# Altium footprint library Components.PcbLib: 260 footprints (part 9 of 17)
Each footprint in its own frame and in the unit in brackets; x right, y up, seen from the top. Pads: shape width x height; smd on the part's side, far side on the other; paste and mask are expansions set on the pad; w line width, h text height; cw(c..) or ccw(c..) is an arc to the next point about the centre after c.
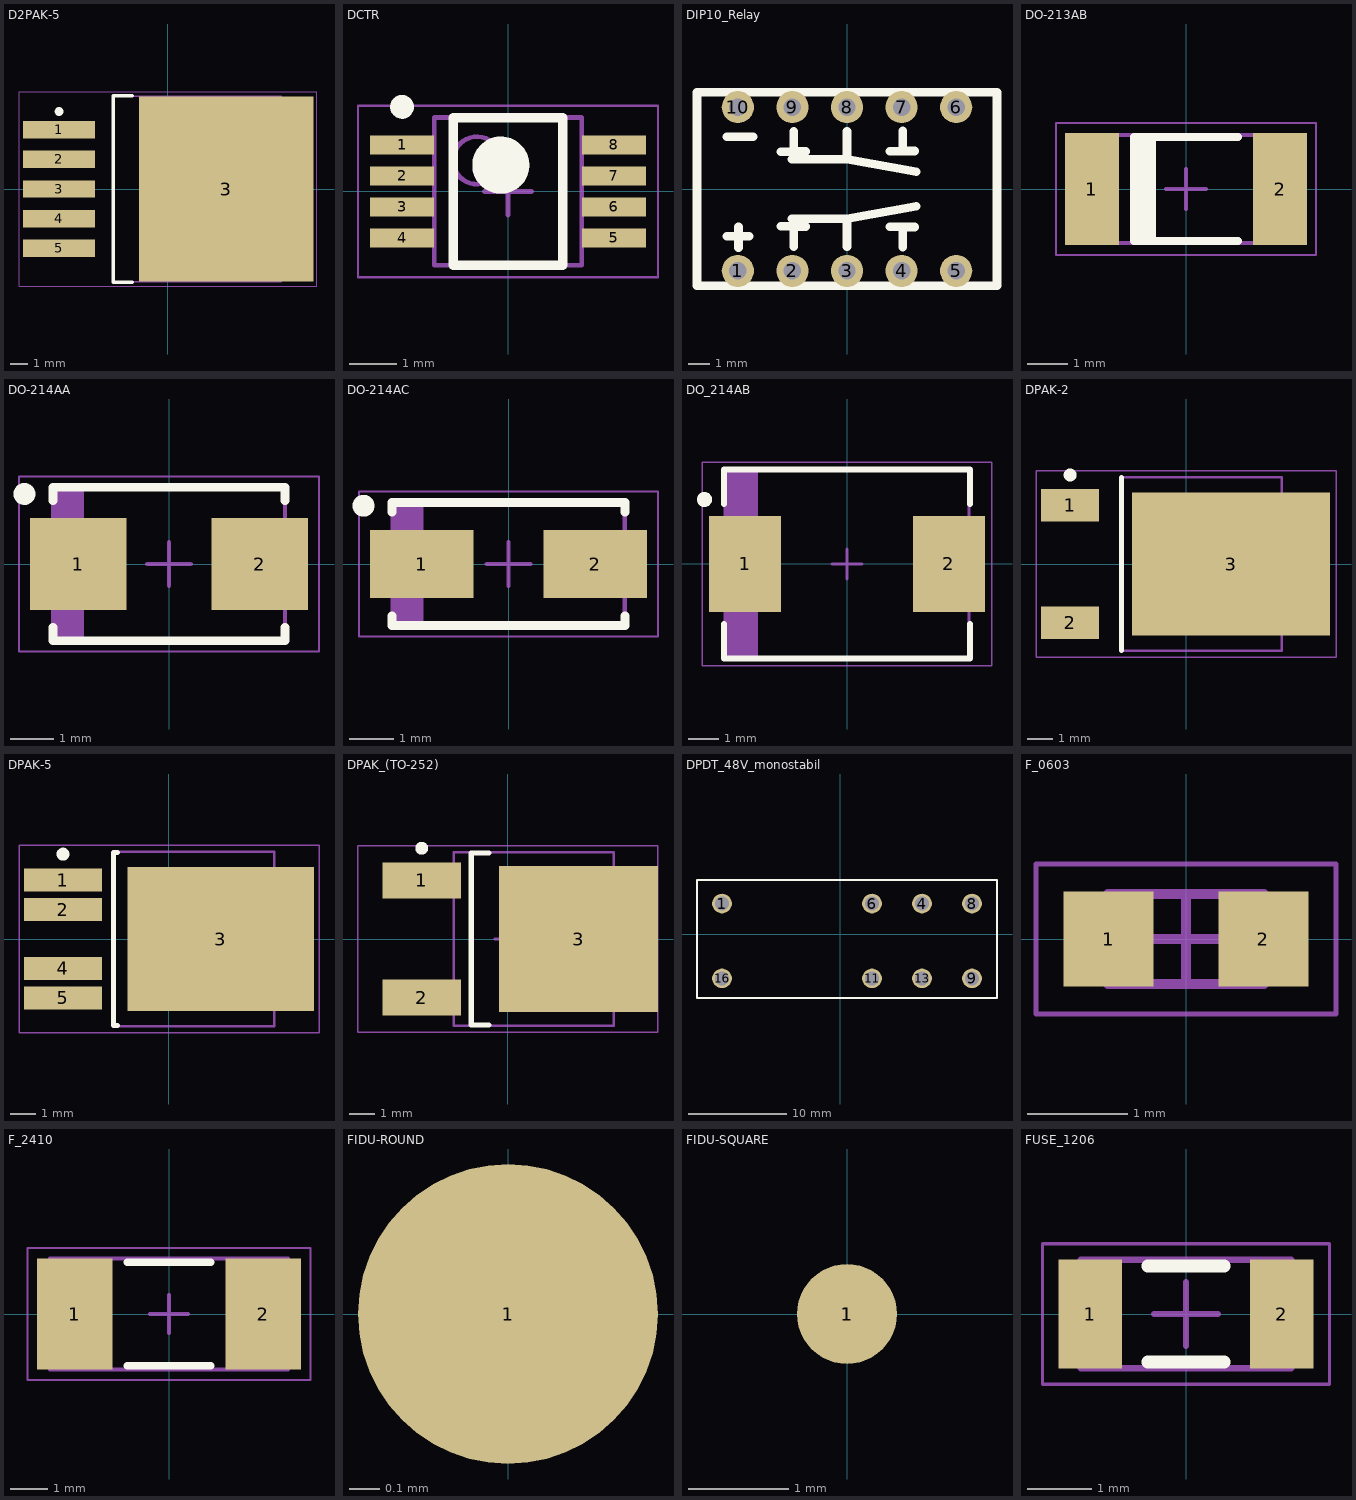
[diagram p8: the footprints below, top view; thin cyan lines are the x and y axes]

## D2PAK-5 [mm]
height 4.83
pads (6):
  rect 4.15x1 smd: 1(-6.25,3.4) 2(-6.25,1.7) 3(-6.25,0) 4(-6.25,-1.7) 5(-6.25,-3.4)
  rect 10x10.65 smd: 3(3.35,0)
Top Overlay:
  circle w0.25: c-6.25,4.45 r0.125
  lines w0.2: -2.05,-5.35 -3.15,-5.35 -3.15,5.35 -2.05,5.35
Mechanical 13:
  lines w0.1: -3.15,-5.325 6.5,-5.325 6.5,5.325 -3.15,5.325 -3.15,-5.325
Mechanical 15:
  lines w0.05: -8.55,-5.575 8.55,-5.575 8.55,5.575 -8.55,5.575 -8.55,-5.575
  lines w0.1: -0.5,0 0.5,0 ; 0,-0.5 0,0.5
3D body "D2PAK-5.STEP": height 4.78, standoff -0.02, extent -7.79,-5 7.88,5

## DCTR [mm] "SN74LVC1G74DCTR"
pads (8):
  rect 1.35x0.4 smd: 1(-2.225,0.975) 2(-2.225,0.325) 3(-2.225,-0.325) 4(-2.225,-0.975) 5(2.225,-0.975) 6(2.225,-0.325) 7(2.225,0.325) 8(2.225,0.975)
Top Overlay:
  circle w0.25: c-2.225,1.775 r0.125
  circle w0.6: c-0.15,0.55 r0.3
  lines w0.2: -1.15,-1.55 -1.15,1.55 1.15,1.55 1.15,-1.55 -1.15,-1.55
Mechanical 13:
  circle w0.1: c-0.65,0.65 r0.5
  lines w0.1: -1.55,-1.55 -1.55,1.55 1.55,1.55 1.55,-1.55 -1.55,-1.55
Mechanical 15:
  lines w0.05: -3.15,-1.8 -3.15,1.8 3.15,1.8 3.15,-1.8 -3.15,-1.8
  lines w0.1: -0.5,0 0.5,0 ; 0,-0.5 0,0.5
3D body "VSSOP-8.step": height 1.09, standoff -0.01, extent -2.5,-1.5 2.5,1.5

## DIP10_Relay [mm]
pads (10):
  round 1.5 hole 0.81: 1(-5.08,-3.81) 2(-2.54,-3.81) 3(0,-3.81) 4(2.54,-3.81) 5(5.08,-3.81) 6(5.08,3.81) 7(2.54,3.81) 8(0,3.81) 9(-2.54,3.81) 10(-5.08,3.81)
Top Overlay:
  lines w0.4: -5.6,-2.2 -4.55,-2.2 ; -5.6,2.425 -4.375,2.425 ; -5.05,-2.725 -5.05,-1.75 ; -3.075,-1.725 -1.925,-1.725 -1.925,-1.75 -2.475,-1.75 -2.475,-2.675 ; -3.075,1.725 -1.925,1.725 -1.925,1.75 -2.475,1.75 -2.475,2.675 ; -2.575,-1.375 0,-1.375 ; -2.575,1.375 0,1.375 ; 0,-2.675 0,-1.375 ; 0,2.675 0,1.375 ; 2,-1.75 3.15,-1.75 3.15,-1.775 2.6,-1.775 2.6,-2.7 ; 2,1.75 3.15,1.75 3.15,1.775 2.6,1.775 2.6,2.7 ; 3.225,-0.8 0,-1.375 ; 3.225,0.8 0,1.375 ; -6.98,-4.5 6.98,-4.5 6.98,4.5 -6.98,4.5 -6.98,-4.5
3D body: height 5, standoff 0, extent -7.025,-4.525 7.025,4.55

## DO-213AB [mm]
height 2.7
pads (2):
  rect 1.35x2.8 smd: 1(-2.35,0) 2(2.35,0)
Top Overlay:
  rectangle: -1.3,-1.3 -0.75,1.3
  lines w0.2: 1.3,-1.3 -1.3,-1.3 -1.3,1.3 1.3,1.3
Mechanical 13:
  lines w0.1: -2.6,-1.35 2.6,-1.35 2.6,1.35 -2.6,1.35 -2.6,-1.35
Mechanical 15:
  lines w0.05: -3.25,-1.65 3.25,-1.65 3.25,1.65 -3.25,1.65 -3.25,-1.65
  lines w0.1: -0.5,0 0.5,0 ; 0,-0.5 0,0.5
3D body: height 2.7, standoff 0, extent 2.04,-1.35 2.6,1.349
3D body: height 2.69, standoff 0.05, extent -2.04,-1.32 2.04,1.32
3D body: height 2.69, standoff 0.04, extent -1.44,-1.321 -0.84,1.32
3D body: height 2.7, standoff 0, extent -2.6,-1.35 -2.04,1.349

## DO-214AA [mm]
height 2.6
pads (2):
  rect 2.2x2.1 smd: 1(-2.075,0) 2(2.075,0)
Top Overlay:
  circle w0.25: c-3.3,1.6 r0.125
  lines w0.2: -2.65,-1.45 -2.65,-1.75 2.65,-1.75 2.65,-1.45 ; -2.65,1.45 -2.65,1.75 2.65,1.75 2.65,1.45
Mechanical 13:
  rectangle: -2.65,-1.74 -1.937,1.74
  lines w0.1: -2.65,-1.74 -2.65,1.74 2.65,1.74 2.65,-1.74 -2.65,-1.74
Mechanical 15:
  lines w0.05: -3.425,-2 -3.425,2 3.425,2 3.425,-2 -3.425,-2
  lines w0.1: -0.5,0 0.5,0 ; 0,-0.5 0,0.5
3D body "SMB.step": height 2.45, standoff 0.03, extent -2.75,-1.95 2.75,1.95

## DO-214AC [mm]
height 2.3
pads (2):
  rect 2.35x1.55 smd: 1(-1.975,0) 2(1.975,0)
Top Overlay:
  circle w0.25: c-3.3,1.325 r0.125
  lines w0.2: -2.65,-1.175 -2.65,-1.4 2.65,-1.4 2.65,-1.175 ; -2.65,1.175 -2.65,1.4 2.65,1.4 2.65,1.175
Mechanical 13:
  rectangle: -2.64,-1.395 -1.93,1.395
  lines w0.1: -2.64,-1.395 -2.64,1.395 2.64,1.395 2.64,-1.395 -2.64,-1.395
Mechanical 15:
  lines w0.05: -3.4,-1.65 -3.4,1.65 3.4,1.65 3.4,-1.65 -3.4,-1.65
  lines w0.1: -0.5,0 0.5,0 ; 0,-0.5 0,0.5
3D body "SMA.step": height 2.6, standoff 0.03, extent -2.75,-1.4 2.75,1.4

## DO_214AB [mm]
height 2.6
pads (2):
  rect 2.4x3.2 smd: 1(-3.4,0) 2(3.4,0)
Top Overlay:
  circle w0.25: c-4.75,2.15 r0.125
  lines w0.2: -4.1,-2 -4.1,-3.15 4.1,-3.15 4.1,-2 ; -4.1,2 -4.1,3.15 4.1,3.15 4.1,2
Mechanical 13:
  rectangle: -4.065,-3.11 -2.972,3.11
  lines w0.1: -4.065,-3.11 -4.065,3.11 4.065,3.11 4.065,-3.11 -4.065,-3.11
Mechanical 15:
  lines w0.05: -4.825,-3.4 -4.825,3.4 4.825,3.4 4.825,-3.4 -4.825,-3.4
  lines w0.1: -0.5,0 0.5,0 ; 0,-0.5 0,0.5
3D body "SMC.step": height 2.4, standoff 0.03, extent -4.065,-3.05 4.065,3.05

## DPAK-2 [mm] "D-PAK, 3-Pads, Body 6,21x6,73mm (max), IPC Medium Density"
height 2.38
pads (3):
  rect 2.25x1.25 smd: 1(-4.5,2.28) 2(-4.5,-2.28)
  rect 7.7x5.55 smd: 3(1.75,0)
Top Overlay:
  circle w0.25: c-4.5,3.455 r0.125
  lines w0.2: -2.5,-3.35 -2.5,3.35
Mechanical 13:
  lines w0.1: -2.5,-3.375 -2.5,3.375 3.72,3.375 3.72,-3.375 -2.5,-3.375
Mechanical 15:
  lines w0.05: -5.825,-3.625 -5.825,3.625 5.825,3.625 5.825,-3.625 -5.825,-3.625
  lines w0.1: -0.5,0 0.5,0 ; 0,-0.5 0,0.5
3D body "DPAK.step": height 2.37, standoff -0.03, extent -5.207,-3.367 4.893,3.367

## DPAK-5 [mm]
height 2.39
pads (5):
  rect 3x0.9 smd: 1(-4.1,2.28) 2(-4.1,1.14) 4(-4.1,-1.14) 5(-4.1,-2.28)
  rect 7.2x5.55 smd: 3(2,0)
Top Overlay:
  circle w0.25: c-4.1,3.28 r0.125
  lines w0.2: -2,-3.35 -2.15,-3.35 -2.15,3.35 -2,3.35
Mechanical 13:
  lines w0.1: -2.15,-3.375 -2.15,3.375 4.07,3.375 4.07,-3.375 -2.15,-3.375
Mechanical 15:
  lines w0.05: -5.8,-3.625 -5.8,3.625 5.8,3.625 5.8,-3.625 -5.8,-3.625
  lines w0.1: -0.5,0 0.5,0 ; 0,-0.5 0,0.5
3D body "DPAK-5.STEP": height 2.3, standoff 0, extent -4.7,-3.25 5.2,3.25

## DPAK_(TO-252) [mm]
height 2.38
pads (3):
  rect 3.05x1.397 smd: 1(-3.345,2.28) 2(-3.345,-2.28)
  rect 6.18x5.69 smd: 3(2.75,0)
Top Overlay:
  circle w0.25: c-3.345,3.528 r0.125
  lines w0.2: -0.74,-3.35 -1.42,-3.35 -1.42,3.35 -0.74,3.35
Mechanical 13:
  lines w0.1: -2.1,-3.375 4.12,-3.375 4.12,3.375 -2.1,3.375 -2.1,-3.375
Mechanical 15:
  lines w0.05: -5.825,-3.625 5.825,-3.625 5.825,3.625 -5.825,3.625 -5.825,-3.625
  lines w0.1: -0.5,0 0.5,0 ; 0,-0.5 0,0.5
3D body: height 2.38, standoff 0, extent -2.1,-3.375 4.12,3.375

## DPDT_48V_monostabil [mm]
pads (8):
  round 2 hole 1.4: 1(-12,3.1) 4(8.32,3.1) 6(3.24,3.1) 8(13.4,3.1) 9(13.4,-4.5) 11(3.24,-4.5) 13(8.32,-4.5) 16(-12,-4.5)
Top Overlay:
  lines w0.2: -14.54,-6.5 15.94,-6.5 15.94,5.5 -14.54,5.5 -14.54,0.57 -14.54,-6.5

## F_0603 [mm]
height 0.44
pads (2):
  rect 0.9x0.95 smd: 1(-0.775,0) 2(0.775,0)
Mechanical 13:
  lines w0.1: -0.78,-0.45 -0.78,0.45 0.78,0.45 0.78,-0.45 -0.78,-0.45
Mechanical 15:
  lines w0.05: -1.5,-0.75 -1.5,0.75 1.5,0.75 1.5,-0.75 -1.5,-0.75
  lines w0.1: -0.45,0 0.45,0 ; 0,-0.45 0,0.45
3D body: height 0.44, standoff 0, extent -0.48,-0.45 0.48,0.45
3D body: height 0.44, standoff 0, extent -0.78,-0.45 -0.48,0.45
3D body: height 0.44, standoff 0, extent 0.48,-0.45 0.78,0.45

## F_2410 [mm]
height 2.94
pads (2):
  rect 2x2.95 smd: 1(-2.5,0) 2(2.5,0)
Top Overlay:
  lines w0.2: -1.1,-1.375 1.1,-1.375 ; -1.1,1.375 1.1,1.375
Mechanical 13:
  lines w0.1: -3.15,-1.47 -3.15,1.47 3.15,1.47 3.15,-1.47 -3.15,-1.47
Mechanical 15:
  lines w0.05: -3.75,-1.75 -3.75,1.75 3.75,1.75 3.75,-1.75 -3.75,-1.75
  lines w0.1: -0.5,0 0.5,0 ; 0,-0.5 0,0.5
3D body: height 2.94, standoff 0, extent -1.75,-1.47 1.75,1.47
3D body: height 2.94, standoff 0, extent -3.15,-1.47 -1.75,1.47
3D body: height 2.94, standoff 0, extent 1.75,-1.47 3.15,1.47

## FIDU-ROUND [mm]
pads (1):
  round 1 smd paste-10 mask+1: 1(0,0)

## FIDU-SQUARE [mm]
pads (2):
  round 1 smd paste-10 mask-10: 1(0,0)
  rect 3x3 on Top Solder: 1(0,0)

## FUSE_1206 [mm] "SMD Fuse, 2-Leads, Body 3,20x1,60mm, IPC Medium Density"
height 1.6
pads (2):
  rect 1x1.7 smd: 1(-1.5,0) 2(1.5,0)
Top Overlay:
  lines w0.2: -0.6,-0.75 0.6,-0.75 ; -0.6,0.75 0.6,0.75
Mechanical 13:
  lines w0.1: -1.65,-0.85 -1.65,0.85 1.65,0.85 1.65,-0.85 -1.65,-0.85
Mechanical 15:
  lines w0.05: -2.25,-1.1 -2.25,1.1 2.25,1.1 2.25,-1.1 -2.25,-1.1
  lines w0.1: -0.5,0 0.5,0 ; 0,-0.5 0,0.5
3D body "FUSE_1206.step": height 1, standoff 0, extent -1.603,-0.8 1.602,0.8